# Altium footprint library USBes.PcbLib: 65 footprints (part 4 of 5)
Each footprint in its own frame and in the unit in brackets; x right, y up, seen from the top. Pads: shape width x height; smd on the part's side, far side on the other; paste and mask are expansions set on the pad; w line width, h text height; cw(c..) or ccw(c..) is an arc to the next point about the centre after c.
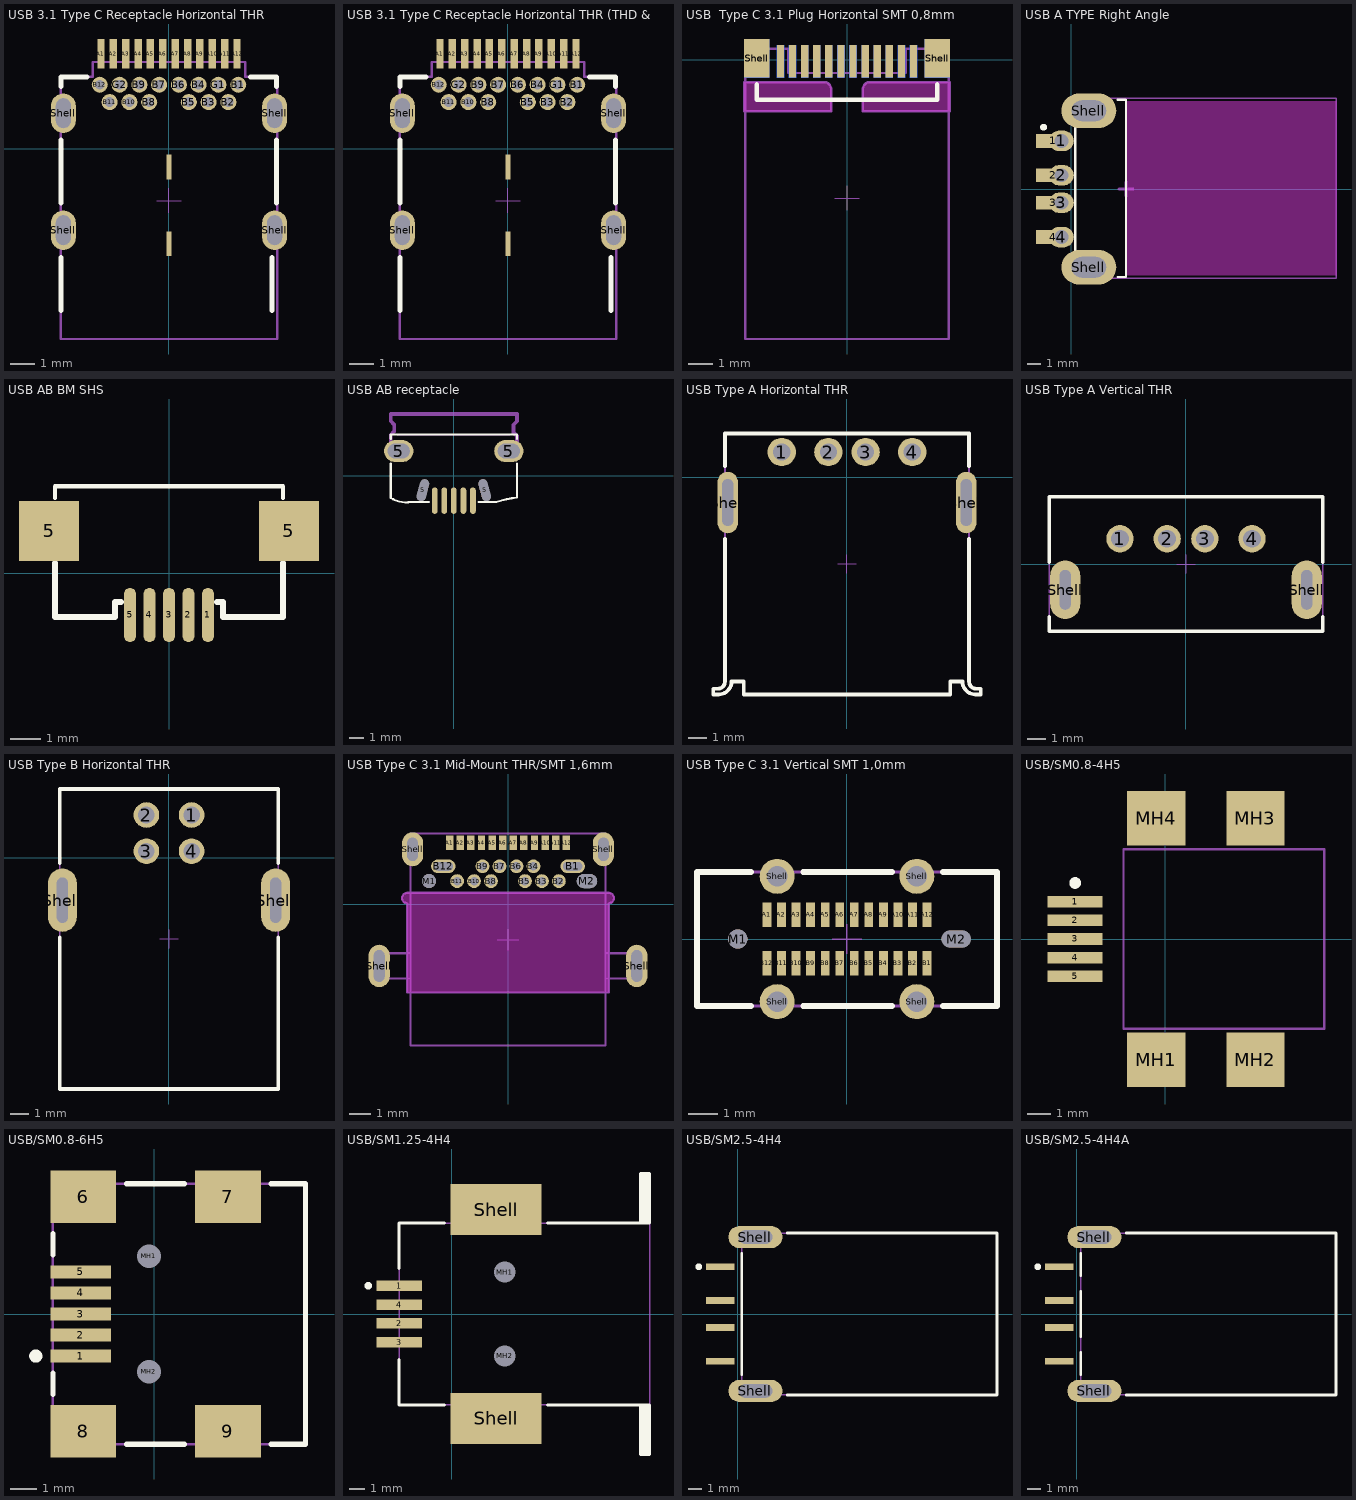
[diagram p3: the footprints below, top view; thin cyan lines are the x and y axes]

## USB 3.1 Type C Receptacle Horizontal THR [mm] "USB 3.1 Type C Receptacle Horizontal THR"
height 2.96
pads (32):
  rect 0.3x1.2 smd: A1(-2.75,3.84) A2(-2.25,3.84) A3(-1.75,3.84) A4(-1.25,3.84) A5(-0.75,3.84) A6(-0.25,3.84) A7(0.25,3.84) A8(0.75,3.84) A9(1.25,3.84) A10(1.75,3.84) A11(2.25,3.84) A12(2.75,3.84)
  round 0.65 hole 0.4: B1(2.8,2.59) B2(2.4,1.89) B3(1.6,1.89) B4(1.2,2.59) B5(0.8,1.89) B6(0.4,2.59) B7(-0.4,2.59) B8(-0.8,1.89) B9(-1.2,2.59) B10(-1.6,1.89) B11(-2.4,1.89) B12(-2.8,2.59) G1(2,2.59) G2(-2,2.59)
  oval 1x1.6 hole 0.6 slot 1.2 at 90 deg: Shell(-4.27,-3.29) Shell(-4.27,1.44) Shell(4.27,-3.29) Shell(4.27,1.44)
  rect 0.2x1 smd: Shell(0,-3.84) Shell(0,-0.74)
Top Overlay:
  lines w0.2: -4.37,-6.54 -4.37,-4.39 ; -4.37,-2.19 -4.37,0.36 ; -4.37,2.51 -4.37,2.91 -3.32,2.91 ; 3.29,2.91 4.34,2.91 4.34,2.51 ; 4.17,-6.54 4.17,-4.39 ; 4.34,-2.19 4.34,0.36
Mechanical 13:
  lines w0.05: -2.85,3.51 -2.85,4.1 -2.65,4.1 -2.65,3.51 ; -2.35,3.51 -2.35,4.1 -2.15,4.1 -2.15,3.51 ; -1.85,3.51 -1.85,4.1 -1.65,4.1 -1.65,3.51 ; -1.35,3.51 -1.35,4.1 -1.15,4.1 -1.15,3.51 ; -0.85,3.51 -0.85,4.1 -0.65,4.1 -0.65,3.51 ; -0.35,3.51 -0.35,4.1 -0.15,4.1 -0.15,3.51 ; 0.15,3.51 0.15,4.1 0.35,4.1 0.35,3.51 ; 0.65,3.51 0.65,4.1 0.85,4.1 0.85,3.51 ; 1.15,3.51 1.15,4.1 1.35,4.1 1.35,3.51 ; 1.65,3.51 1.65,4.1 1.85,4.1 1.85,3.51 ; 2.15,3.51 2.15,4.1 2.35,4.1 2.35,3.51 ; 2.65,3.51 2.65,4.1 2.85,4.1 2.85,3.51
  lines w0.1: 4.34,-7.69 -4.37,-7.69 -4.37,2.91 -3.08,2.91 -3.08,3.51 3.08,3.51 3.08,2.91 4.37,2.91 4.37,-7.69
Mechanical 15:
  lines w0.05: -0.5,-2.09 0.5,-2.09 ; 0,-2.59 0,-1.59
3D body "632723100011.stp": height 3.05, standoff -1.81, extent -4.37,-7.69 4.37,4.104

## USB 3.1 Type C Receptacle Horizontal THR (THD & SMD) [mm] "USB 3.1 Type C Receptacle Horizontal THR (THD & SMD)"
height 2.96
pads (32):
  rect 0.3x1.2 smd: A1(-2.75,3.84) A2(-2.25,3.84) A3(-1.75,3.84) A4(-1.25,3.84) A5(-0.75,3.84) A6(-0.25,3.84) A7(0.25,3.84) A8(0.75,3.84) A9(1.25,3.84) A10(1.75,3.84) A11(2.25,3.84) A12(2.75,3.84)
  round 0.65 hole 0.4: B1(2.8,2.59) B2(2.4,1.89) B3(1.6,1.89) B4(1.2,2.59) B5(0.8,1.89) B6(0.4,2.59) B7(-0.4,2.59) B8(-0.8,1.89) B9(-1.2,2.59) B10(-1.6,1.89) B11(-2.4,1.89) B12(-2.8,2.59) G1(2,2.59) G2(-2,2.59)
  oval 1x1.6 hole 0.6 slot 1.2 at 90 deg: Shell(-4.27,-3.29) Shell(-4.27,1.44) Shell(4.27,-3.29) Shell(4.27,1.44)
  rect 0.2x1 smd: Shell(0,-3.84) Shell(0,-0.74)
Top Overlay:
  lines w0.2: -4.37,-6.54 -4.37,-4.39 ; -4.37,-2.19 -4.37,0.36 ; -4.37,2.51 -4.37,2.91 -3.32,2.91 ; 3.29,2.91 4.34,2.91 4.34,2.51 ; 4.17,-6.54 4.17,-4.39 ; 4.34,-2.19 4.34,0.36
Mechanical 13:
  lines w0.05: -2.85,3.51 -2.85,4.1 -2.65,4.1 -2.65,3.51 ; -2.35,3.51 -2.35,4.1 -2.15,4.1 -2.15,3.51 ; -1.85,3.51 -1.85,4.1 -1.65,4.1 -1.65,3.51 ; -1.35,3.51 -1.35,4.1 -1.15,4.1 -1.15,3.51 ; -0.85,3.51 -0.85,4.1 -0.65,4.1 -0.65,3.51 ; -0.35,3.51 -0.35,4.1 -0.15,4.1 -0.15,3.51 ; 0.15,3.51 0.15,4.1 0.35,4.1 0.35,3.51 ; 0.65,3.51 0.65,4.1 0.85,4.1 0.85,3.51 ; 1.15,3.51 1.15,4.1 1.35,4.1 1.35,3.51 ; 1.65,3.51 1.65,4.1 1.85,4.1 1.85,3.51 ; 2.15,3.51 2.15,4.1 2.35,4.1 2.35,3.51 ; 2.65,3.51 2.65,4.1 2.85,4.1 2.85,3.51
  lines w0.1: 4.34,-7.69 -4.37,-7.69 -4.37,2.91 -3.08,2.91 -3.08,3.51 3.08,3.51 3.08,2.91 4.37,2.91 4.37,-7.69
Mechanical 15:
  lines w0.05: -0.5,-2.09 0.5,-2.09 ; 0,-2.59 0,-1.59
3D body "632723300011.stp": height 3.05, standoff -1.81, extent -4.37,-7.69 4.37,4.104

## USB  Type C 3.1 Plug Horizontal SMT 0,8mm [mm] "USB  Type C 3.1 Plug Horizontal SMT 0,8mm"
height 3.87
pads (28):
  rect 0.3x1.35 smd: A1(2.75,-0.062) A2(2.25,-0.062) A3(1.75,-0.062) A4(1.25,-0.062) A5(0.75,-0.062) A6(0.25,-0.062) A7(-0.25,-0.062) A8(-0.75,-0.062) A9(-1.25,-0.062) A10(-1.75,-0.062) A11(-2.25,-0.062) A12(-2.75,-0.062)
  rect 0.3x1.35 smd far side: B1(-2.75,-0.062) B2(-2.25,-0.062) B3(-1.75,-0.062) B4(-1.25,-0.062) B5(-0.75,-0.062) B6(-0.25,-0.062) B7(0.25,-0.062) B8(0.75,-0.062) B9(1.25,-0.062) B10(1.75,-0.062) B11(2.25,-0.062) B12(2.75,-0.062)
  rect 1.04x1.6 smd: Shell(-3.73,0.062) Shell(3.73,0.062)
  rect 1.04x1.6 smd far side: Shell(-3.73,0.062) Shell(3.73,0.062)
Top Overlay:
  lines w0.2: -3.73,-1.016 -3.73,-1.651 3.73,-1.651 3.73,-1.016
Keep-Out Layer:
  board cut-out: -4.25,-2.117 -4.25,-0.918 -0.95,-0.918 -0.89,-0.918 -0.78,-0.963 -0.696,-1.048 -0.65,-1.158 -0.65,-1.218 -0.65,-2.118
  board cut-out: 0.65,-2.118 0.65,-1.218 0.65,-1.158 0.696,-1.048 0.78,-0.963 0.89,-0.918 0.95,-0.918 4.25,-0.918 4.25,-2.118
Mechanical 8:
  lines w0.1: 4.25,-0.918 4.25,-2.118 0.65,-2.118 0.65,-1.218 cw(c0.95,-1.218) 0.95,-0.918 4.25,-0.918 ; -4.25,-2.118 -0.65,-2.118 -0.65,-1.218 ccw(c-0.95,-1.218) -0.95,-0.918 -4.25,-0.918 -4.25,-2.117
Mechanical 13:
  lines w0.1: -4.215,-11.542 4.215,-11.542 4.215,0.458 2.43,0.458 2.43,-0.542 -2.43,-0.542 -2.43,0.458 -4.215,0.458 -4.215,-11.542
Mechanical 15:
  lines w0.05: -0.5,-5.713 0.5,-5.713 ; 0,-6.213 0,-5.213
3D body "632712000112.stp": height 1.51, standoff -2.21, extent -4.215,-11.543 4.215,0.457

## USB A TYPE Right Angle [mm] "Connector; USB1.1, Type A, SM; 4 Position; Right Angle"
height 4.5
pads (10):
  rect 2.5x1 smd: 1(-1.3,3.5) 2(-1.3,1) 3(-1.3,-1) 4(-1.3,-3.5)
  oval 1.8x1.5 hole 1: 1(-0.7,3.5) 2(-0.7,1) 3(-0.7,-1) 4(-0.7,-3.5)
  oval 4x2.5 hole 1.5 slot 2.5 at 0 deg: Shell(1.3,-5.7) Shell(1.3,5.7)
Top Overlay:
  circle w0.25: c-2,4.5 r0.125
  lines w0.15: 3.4,-6.4 4,-6.4 4,6.5 3.4,6.5
  lines w0.2: 0.3,-4.475 0.3,4.475
Keep-Out Layer:
  board cut-out: 4,6.4 4,-6.3 19.3,-6.3 19.3,6.4
Mechanical 1:
  lines w0.1: 4,-6 4,6
Mechanical 13:
  lines w0.1: 0.3,-6.5 0.3,6.6 19.3,6.6 19.3,-6.5 0.3,-6.5
Mechanical 15:
  lines w0.2: 3.5,0 4.5,0 ; 4,-0.5 4,0.5
3D body "UP2-AH-1-TH.stEp": height 3.45, standoff -2.9, extent -0.9,-6.298 19.1,6.298

## USB AB BM SHS [mm] "USB Micro AB - Standard (Bottom mount), Shell SMT"
height 2.8
pads (7):
  oval 0.4x1.8 smd: 1(1.3,-1.4) 2(0.65,-1.4) 3(0,-1.4) 4(-0.65,-1.4) 5(-1.3,-1.4)
  rect 2x2 smd: 5(-4,1.4) 5(4,1.4)
Top Overlay:
  lines w0.15: -3.8,2.5 -3.8,2.9 3.8,2.9 3.8,2.5
  lines w0.2: -3.8,0.33 -3.8,-0.17 -3.8,-1.47 -1.9,-1.47 -1.8,-1.47 -1.8,-0.97 -1.6,-0.97 ; 1.6,-0.97 1.8,-0.97 1.8,-1.47 1.9,-1.47 3.8,-1.47 3.8,-0.17 3.8,0.33
3D body "65944.stEp": height 2.75, standoff -0.55, extent -4,-1.78 4,4.264

## USB AB receptacle [mm] "USB Micro AB - receptacle"
height 2.8
pads (9):
  oval 0.4x1.8 smd mask+0.05: 1(1.3,-1.687) 2(0.65,-1.687) 3(0,-1.687) 4(-0.65,-1.687) 5(-1.3,-1.687)
  oval 2x1.5 hole 1 slot 1.5 at 0 deg mask+0.05: 5(-3.75,1.687) 5(3.75,1.687)
  oval 1.5x0.6 hole 0.6 slot 1.5 at 75 deg rot 75 mask+0.05: 5(-2.1,-0.975)
  oval 1.5x0.6 hole 0.6 slot 1.5 at 105 deg rot 105 mask+0.05: 5(2.1,-0.975)
Top Overlay:
  lines w0.15: -4.307,-1.491 ccw(c-3.256,0.091) -2.9,-1.775 -1.7,-1.775 ; -4.3,-1.475 -4.3,0.825 ; -4.3,2.525 -4.3,2.813 -4.288,2.825 4.3,2.825 4.3,2.525 ; 1.7,-1.775 2.9,-1.775 cw(c5.142,-8.822) 4.3,-1.475 4.3,0.825
Mechanical 1:
  lines w0.1: -3.8,2.807 3.8,2.807
Mechanical 13:
  lines w0.254: -4.3,2.313 -4.3,2.788 -4.064,3.024 -4.064,3.502 -4.3,3.738 -4.3,4.213 4.3,4.213 4.3,3.713 4.064,3.477 4.064,2.949 4.3,2.713 4.3,2.213
3D body "48281.stEp": height 2.8, standoff -0.6, extent -4.325,-1.587 4.325,4.312

## USB Type A Horizontal THR [mm] "USB Type A Horizontal THR"
height 7.25
pads (6):
  round 1.52 hole 0.92: 1(-3.5,1.355) 2(-1,1.355) 3(1,1.355) 4(3.5,1.355)
  oval 1.1x3.3 hole 0.6 slot 2.5 at 90 deg: Shell(-6.4,-1.355) Shell(6.4,-1.355)
Top Overlay:
  lines w0.2: -6.972,-11.355 -7.175,-11.355 -7.175,-11.655 -6.895,-11.655 ccw(c-6.895,-10.955) -6.195,-10.955 -5.545,-10.955 -5.545,-11.655 5.545,-11.655 5.545,-10.955 6.195,-10.955 ccw(c6.895,-10.955) 6.895,-11.655 7.175,-11.655 7.175,-11.355 6.972,-11.355 ; -6.972,-11.354 ccw(c-6.95,-10.955) -6.55,-10.955 -6.55,-3.305 ; -6.55,0.595 -6.55,2.345 6.55,2.345 6.55,0.595 ; 6.55,-3.305 6.55,-10.955 ccw(c6.95,-10.955) 6.972,-11.354
Mechanical 13:
  lines w0.1: -6.972,-11.355 -7.175,-11.355 -7.175,-11.655 -6.895,-11.655 ccw(c-6.895,-10.955) -6.195,-10.955 -5.545,-10.955 -5.545,-11.655 5.545,-11.655 5.545,-10.955 6.195,-10.955 ccw(c6.895,-10.955) 6.895,-11.655 7.175,-11.655 7.175,-11.355 6.972,-11.355 ; -6.972,-11.354 ccw(c-6.95,-10.955) -6.55,-10.955 -6.55,2.345 6.55,2.345 6.55,-10.955 ccw(c6.95,-10.955) 6.972,-11.354
Mechanical 15:
  lines w0.05: -0.5,-4.655 0.5,-4.655 ; 0,-5.155 0,-4.155
3D body "61410416021R.stp": height 7.5, standoff -2.19, extent -7.225,-11.655 7.225,2.345

## USB Type A Vertical THR [mm] "USB Type A Vertical THR"
height 14.9
pads (6):
  round 1.45 hole 0.95: 1(-3.5,1.355) 2(-1,1.355) 3(1,1.355) 4(3.5,1.355)
  oval 1.6x3.1 hole 0.6 slot 2.1 at 90 deg: Shell(-6.4,-1.355) Shell(6.4,-1.355)
Top Overlay:
  lines w0.2: -7.25,-2.795 -7.25,-3.545 7.25,-3.545 7.25,-2.795 ; -7.25,0.105 -7.25,3.575 7.25,3.575 7.25,0.105
Mechanical 13:
  lines w0.1: -7.25,-3.545 7.25,-3.545 7.25,3.575 -7.25,3.575 -7.25,-3.545
Mechanical 15:
  lines w0.05: -0.5,0.015 0.5,0.015 ; 0,-0.485 0,0.515
3D body "614104135023R.stp": height 14.93, standoff -2.16, extent -7.25,-3.545 7.25,3.575

## USB Type B Horizontal THR [mm] "USB Type B Horizontal THR"
height 11
pads (6):
  round 1.42 hole 0.92: 1(1.25,2.355) 2(-1.25,2.355) 3(-1.25,0.355) 4(1.25,0.355)
  oval 1.6x3.5 hole 0.6 slot 2.5 at 90 deg: Shell(-5.9,-2.355) Shell(5.9,-2.355)
Top Overlay:
  lines w0.2: -6.05,-4.405 -6.05,-12.805 6.05,-12.805 6.05,-4.405 ; -6.05,-0.305 -6.05,3.795 6.05,3.795 6.05,-0.305
Mechanical 13:
  lines w0.1: -6.05,-12.805 6.05,-12.805 6.05,3.795 -6.05,3.795 -6.05,-12.805
Mechanical 15:
  lines w0.05: -0.5,-4.505 0.5,-4.505 ; 0,-5.005 0,-4.005
3D body "61410416121R.stp": height 11.05, standoff -2.15, extent -6.2,-12.805 6.2,3.795

## USB Type C 3.1 Mid-Mount THR/SMT 1,6mm [mm] "USB Type C 3.1 Mid-Mount THR/SMT 1,6mm"
height 3.42
pads (30):
  rect 0.35x0.7 smd: A1(-2.75,2.905) A2(-2.25,2.905) A3(-1.75,2.905) A4(-1.25,2.905) A5(-0.75,2.905) A6(-0.25,2.905) A7(0.25,2.905) A8(0.75,2.905) A9(1.25,2.905) A10(1.75,2.905) A11(2.25,2.905) A12(2.75,2.905)
  oval 1.15x0.65 hole 0.4 slot 0.9 at 0 deg: B1(3.05,1.795) B12(-3.05,1.795)
  round 0.65 hole 0.4: B2(2.4,1.095) B3(1.6,1.095) B4(1.2,1.795) B5(0.8,1.095) B6(0.4,1.795) B7(-0.4,1.795) B8(-0.8,1.095) B9(-1.2,1.795) B10(-1.6,1.095) B11(-2.4,1.095)
  round 0.65 hole 0.65 unplated: M1(-3.725,1.095)
  oval 0.95x0.65 hole 0.65 slot 0.95 at 0 deg unplated: M2(3.725,1.095)
  oval 1x2 hole 0.5 slot 1.5 at 90 deg: Shell(-6.075,-2.905) Shell(6.075,-2.905)
  oval 1x1.6 hole 0.5 slot 1.1 at 90 deg: Shell(-4.5,2.595) Shell(4.5,2.595)
Keep-Out Layer:
  board cut-out: -4.75,-4.155 4.75,-4.155 4.75,0.045 4.8,0.045 4.892,0.083 4.962,0.153 5,0.245 5,0.345 4.962,0.437 4.892,0.507 4.8,0.545 4.75,0.545 -4.75,0.545 -4.8,0.545 -4.892,0.507 -4.962,0.437 -5,0.345 -5,0.245 -4.962,0.153 -4.892,0.083 -4.8,0.045 -4.75,0.045
Mechanical 2:
  lines w0.1: -4.75,-4.155 4.75,-4.155
Mechanical 8:
  lines w0.1: -4.75,-4.155 -4.75,0.045 cw(c-4.75,0.295) -4.75,0.545 4.75,0.545 cw(c4.75,0.295) 4.75,0.045 4.75,-4.155 -4.75,-4.155
Mechanical 13:
  lines w0.1: -4.6,-3.505 -6.175,-3.505 -6.175,-2.305 -4.6,-2.305 ; 4.6,-3.505 6.175,-3.505 6.175,-2.305 4.6,-2.305 ; -4.6,-6.665 -4.6,3.335 4.6,3.335 4.6,-6.665 -4.6,-6.665
Mechanical 15:
  lines w0.05: -0.5,-1.665 0.5,-1.665 ; 0,-2.165 0,-1.165
3D body "632723130112.stp": height 2.04, standoff -1.56, extent -6.175,-6.665 6.175,3.329

## USB Type C 3.1 Vertical SMT 1,0mm [mm] "USB Type C 3.1 Vertical SMT 1,0mm"
height 7.6
pads (30):
  rect 0.3x0.85 smd: A1(-2.75,0.83) A2(-2.25,0.83) A3(-1.75,0.83) A4(-1.25,0.83) A5(-0.75,0.83) A6(-0.25,0.83) A7(0.25,0.83) A8(0.75,0.83) A9(1.25,0.83) A10(1.75,0.83) A11(2.25,0.83) A12(2.75,0.83) B1(2.75,-0.83) B2(2.25,-0.83) B3(1.75,-0.83) B4(1.25,-0.83) B5(0.75,-0.83) B6(0.25,-0.83) B7(-0.25,-0.83) B8(-0.75,-0.83) B9(-1.25,-0.83) B10(-1.75,-0.83) B11(-2.25,-0.83) B12(-2.75,-0.83)
  round 0.66 hole 0.66 unplated: M1(-3.75,0)
  oval 1x0.58 hole 0.58 slot 1 at 0 deg unplated: M2(3.75,0)
  round 1.2 hole 0.7: Shell(-2.4,-2.15) Shell(-2.4,2.15) Shell(2.4,-2.15) Shell(2.4,2.15)
Top Overlay:
  lines w0.2: -3.3,-2.3 -5.15,-2.3 -5.15,2.3 -3.3,2.3 ; -1.5,-2.3 1.55,-2.3 ; -1.5,2.3 1.55,2.3 ; 3.3,-2.3 5.15,-2.3 5.15,2.3 3.3,2.3
Mechanical 13:
  lines w0.1: -5.15,-2.3 5.15,-2.3 5.15,2.3 -5.15,2.3 -5.15,-2.3
Mechanical 15:
  lines w0.05: -0.5,0 0.5,0 ; 0,-0.5 0,0.5
3D body "632722110112.stp": height 7.95, standoff -1.32, extent -5.15,-2.3 5.15,2.3

## USB/SM0.8-4H5 [mm] "Connector; USB Mini-B, Sinking Type, SM; 5 Position; Right Angle"
height 0.65
pads (9):
  rect 2.35x0.5 smd: 1(-3.862,1.6) 2(-3.862,0.8) 3(-3.862,0) 4(-3.862,-0.8) 5(-3.862,-1.6)
  rect 2.5x2.35 smd: MH1(-0.387,-5.175) MH2(3.863,-5.175) MH3(3.863,5.175) MH4(-0.387,5.175)
Top Overlay:
  circle w0.25: c-3.862,2.4 r0.125
Mechanical 13:
  lines w0.1: -1.788,-3.85 -1.788,3.85 6.813,3.85 6.813,-3.85 -1.788,-3.85
3D body "usb_a-usb_b-m5-smd-c.STEP": height 3.93, standoff -1, extent -1.831,-5.08 7.419,4.82

## USB/SM0.8-6H5 [mm] "Connector; USB2.0, Type B, SM; 5 Position; Right Angle"
height 3.9
pads (11):
  rect 2.3x0.5 smd: 1(-2.8,-1.6) 2(-2.8,-0.8) 3(-2.8,0) 4(-2.8,0.8) 5(-2.8,1.6)
  rect 2.5x2 smd: 6(-2.7,4.45) 7(2.8,4.45) 8(-2.7,-4.45) 9(2.8,-4.45)
  round 0.6 hole 0.9 unplated: MH1(-0.2,2.2) MH2(-0.2,-2.2)
Top Overlay:
  circle w0.25: c-4.5,-1.6 r0.125
  lines w0.2: -3.85,-3.05 -3.85,-2.25 ; -3.85,2.25 -3.85,3.05 ; -1.05,-4.95 1.15,-4.95 ; -1.05,4.95 1.15,4.95 ; 4.45,-4.95 5.75,-4.95 5.75,4.95 4.45,4.95
Mechanical 13:
  lines w0.1: -3.85,-4.95 -3.85,4.95 5.75,4.95 5.75,-4.95 -3.85,-4.95
3D body "usb_a-usb_b-m5-smd-c.STEP": height 3.93, standoff -1, extent -3.55,-4.95 5.7,4.95

## USB/SM1.25-4H4 [mm] "Connector; USB1.1, Type B, SM; 4 Position; Right Angle"
height 11
pads (8):
  rect 3x0.7 smd: 1(-3.5,1.875) 2(-3.5,-0.625) 3(-3.5,-1.875) 4(-3.5,0.625)
  round 1.1 hole 1.4 unplated: MH1(3.5,2.775) MH2(3.5,-2.775)
  rect 6.04x3.4 smd: Shell(2.92,-6.92) Shell(2.92,6.92)
Top Overlay:
  circle w0.25: c-5.55,1.875 r0.125
  rectangle: 12.5,6.02 13.1,9.32
  rectangle: 12.5,-9.32 13.1,-6.02
  lines w0.2: -3.5,-3 -3.5,-6.02 -0.5,-6.02 ; -3.5,3 -3.5,6.02 -0.5,6.02 ; 6.34,-6.02 12.5,-6.02 ; 6.34,6.02 12.5,6.02 ; 12.5,-6.02 12.5,-9.32 13.1,-9.32 13.1,-6.02 12.5,-6.02 ; 12.5,6.02 12.5,9.32 13.1,9.32 13.1,6.02 12.5,6.02
Mechanical 13:
  lines w0.1: 12.5,-6.02 12.5,-9.32 13.1,-9.32 13.1,9.32 12.5,9.32 12.5,6.02 ; 13.1,-6.02 -3.5,-6.02 -3.5,6.02 13.1,6.02
3D body "Samtec-DEFAULT.STEP": height 11.05, standoff 0.55, extent 3.305,-5.498 69.255,5.702
3D body "14383.STEP": height 11, standoff -1.5, extent -4.635,-8.103 12.515,8.097

## USB/SM2.5-4H4 [mm] "Connector; USB1.1, Type A, SM; 4 Position; Right Angle"
height 4.5
pads (6):
  rect 2.1x0.5 smd: 1(-1.3,3.5) 2(-1.3,1) 3(-1.3,-1) 4(-1.3,-3.5)
  oval 4x1.65 hole 1 slot 2.5 at 0 deg: Shell(1.3,-5.7) Shell(1.3,5.7)
Top Overlay:
  circle w0.25: c-2.9,3.5 r0.125
  lines w0.2: 0.3,-4.475 0.3,4.475 ; 3.67,-6 19.2,-6 19.2,6 3.67,6
Mechanical 13:
  lines w0.1: 0.3,-6 19.2,-6 19.2,6 0.3,6 0.3,-6
3D body "14381.STEP": height 4.5, standoff -1.3, extent -1.3,-6.299 19,6.303

## USB/SM2.5-4H4A [mm] "Connector; USB1.1, Type A, SM; 4 Position; Right Angle"
height 4.5
pads (6):
  rect 2.1x0.5 smd: 1(-1.3,3.5) 2(-1.3,1) 3(-1.3,-1) 4(-1.3,-3.5)
  oval 4x1.65 hole 1 slot 2.5 at 0 deg: Shell(1.3,-5.7) Shell(1.3,5.7)
Top Overlay:
  circle w0.25: c-2.9,3.5 r0.125
  lines w0.2: 0.3,-4.475 0.3,-2.83 ; 0.3,-1.68 0.3,1.68 ; 0.3,2.83 0.3,4.475 ; 3.67,-6 19.2,-6 19.2,6 3.67,6
Mechanical 13:
  lines w0.1: 0.3,-6 19.2,-6 19.2,6 0.3,6 0.3,-6
3D body "14381.STEP": height 4.5, standoff -1.3, extent -1.25,-6.296 19.05,6.306